# Altium integrated library Weidmueller_OMNIMATE_Power.IntLib: 508 symbols (part 3 of 9) (continued)
## 1095660000_Single (continued)
OMNIMATE Power - series BL/SL 7.62HP; PartNumber: 1095660000; Manufacturer: Weidmueller; Short_text_for_material: BLL 7.62HP/04/90LF SN BK BX; Side_termination_characteristic: Solder flange; Mounting_onto_the_PCB: Solder connection; Pitch_mm: 7.62 mm; Pitch_inch: 0.3 inch; No_of_poles: 4; Solder_pin_length_mm: 3.2 mm; Contact_material: Cu-Leg; Contact_surface: tinned; Insulating_material: PA GF; UL_94_flammability_rating: V-0; Rated_voltage_for_surge_voltage_class_pollution_degree_II_2: 630 V; Rated_voltage_use_group_B_UL_1059: 300 V; Rated_current_use_group_B_UL_1059: 20 A; PackageReference: BLL_7_62HP_90LF_04; Colour: Black; Packaging: Box; Qty: 42 PCS; Revision: V1; ComponentLink1Description: Manufacturer URL; ComponentLink1URL: http://www.weidmueller.com/; ComponentLink2Description: URL Link1; ComponentLink2URL: http://catalog.weidmueller.com/catalog/Start.do?localeId=en&ObjectID=1095660000
footprint BLL_7_62HP_90LF_04 (OMNIMATE Power - Serie BL/SL 7.62HP  BLL 7.62HP/04/90)
part A pins: A1
part B pins: A2
part C pins: A3
part D pins: A4

## 1095920000
designator J?
OMNIMATE Power - series BL/SL 7.62HP; PartNumber: 1095920000; Manufacturer: Weidmueller; Short_text_for_material: SL 7.62HP/02/90LF 3.2 SN BK BX; Side_termination_characteristic: Solder flange; Mounting_onto_the_PCB: Solder connection; Pitch_mm: 7.62 mm; Pitch_inch: 0.3 inch; No_of_poles: 2; Outgoing_elbow: 90°; Solder_pin_length_mm: 3.2 mm; Contact_material: Cu-Leg; Contact_surface: tinned; Insulating_material: PBT; UL_94_flammability_rating: V-0; Rated_voltage_for_surge_voltage_class_pollution_degree_II_2: 630 V; Rated_voltage_use_group_B_UL_1059: 300 V; Rated_current_use_group_B_UL_1059: 20 A; PackageReference: SL_7_62HP_90LF_02; Colour: Black; Packaging: Box; Qty: 100 PCS; Revision: V1; ComponentLink1Description: Manufacturer URL; ComponentLink1URL: http://www.weidmueller.com/; ComponentLink2Description: URL Link1; ComponentLink2URL: http://catalog.weidmueller.com/catalog/Start.do?localeId=en&ObjectID=1095920000
footprint SL_7_62HP_90LF_02 (OMNIMATE Power - Serie BL/SL 7.62HP  SL 7.62HP/02/90F 3.2)
pins: A1, A2

## 1095920000_Single
designator J?
OMNIMATE Power - series BL/SL 7.62HP; PartNumber: 1095920000; Manufacturer: Weidmueller; Short_text_for_material: SL 7.62HP/02/90LF 3.2 SN BK BX; Side_termination_characteristic: Solder flange; Mounting_onto_the_PCB: Solder connection; Pitch_mm: 7.62 mm; Pitch_inch: 0.3 inch; No_of_poles: 2; Outgoing_elbow: 90°; Solder_pin_length_mm: 3.2 mm; Contact_material: Cu-Leg; Contact_surface: tinned; Insulating_material: PBT; UL_94_flammability_rating: V-0; Rated_voltage_for_surge_voltage_class_pollution_degree_II_2: 630 V; Rated_voltage_use_group_B_UL_1059: 300 V; Rated_current_use_group_B_UL_1059: 20 A; PackageReference: SL_7_62HP_90LF_02; Colour: Black; Packaging: Box; Qty: 100 PCS; Revision: V1; ComponentLink1Description: Manufacturer URL; ComponentLink1URL: http://www.weidmueller.com/; ComponentLink2Description: URL Link1; ComponentLink2URL: http://catalog.weidmueller.com/catalog/Start.do?localeId=en&ObjectID=1095920000
footprint SL_7_62HP_90LF_02 (OMNIMATE Power - Serie BL/SL 7.62HP  SL 7.62HP/02/90F 3.2)
part A pins: A1
part B pins: A2

## 1095930000
designator J?
OMNIMATE Power - series BL/SL 7.62HP; PartNumber: 1095930000; Manufacturer: Weidmueller; Short_text_for_material: SL 7.62HP/03/90LF 3.2 SN BK BX; Side_termination_characteristic: Solder flange; Mounting_onto_the_PCB: Solder connection; Pitch_mm: 7.62 mm; Pitch_inch: 0.3 inch; No_of_poles: 3; Outgoing_elbow: 90°; Solder_pin_length_mm: 3.2 mm; Contact_material: Cu-Leg; Contact_surface: tinned; Insulating_material: PBT; UL_94_flammability_rating: V-0; Rated_voltage_for_surge_voltage_class_pollution_degree_II_2: 630 V; Rated_voltage_use_group_B_UL_1059: 300 V; Rated_current_use_group_B_UL_1059: 20 A; PackageReference: SL_7_62HP_90LF_03; Colour: Black; Packaging: Box; Qty: 100 PCS; Revision: V1; ComponentLink1Description: Manufacturer URL; ComponentLink1URL: http://www.weidmueller.com/; ComponentLink2Description: URL Link1; ComponentLink2URL: http://catalog.weidmueller.com/catalog/Start.do?localeId=en&ObjectID=1095930000
footprint SL_7_62HP_90LF_03 (OMNIMATE Power - Serie BL/SL 7.62HP  SL 7.62HP/03/90F 3.2)
pins: A1, A2, A3

## 1095930000_Single
designator J?
OMNIMATE Power - series BL/SL 7.62HP; PartNumber: 1095930000; Manufacturer: Weidmueller; Short_text_for_material: SL 7.62HP/03/90LF 3.2 SN BK BX; Side_termination_characteristic: Solder flange; Mounting_onto_the_PCB: Solder connection; Pitch_mm: 7.62 mm; Pitch_inch: 0.3 inch; No_of_poles: 3; Outgoing_elbow: 90°; Solder_pin_length_mm: 3.2 mm; Contact_material: Cu-Leg; Contact_surface: tinned; Insulating_material: PBT; UL_94_flammability_rating: V-0; Rated_voltage_for_surge_voltage_class_pollution_degree_II_2: 630 V; Rated_voltage_use_group_B_UL_1059: 300 V; Rated_current_use_group_B_UL_1059: 20 A; PackageReference: SL_7_62HP_90LF_03; Colour: Black; Packaging: Box; Qty: 100 PCS; Revision: V1; ComponentLink1Description: Manufacturer URL; ComponentLink1URL: http://www.weidmueller.com/; ComponentLink2Description: URL Link1; ComponentLink2URL: http://catalog.weidmueller.com/catalog/Start.do?localeId=en&ObjectID=1095930000
footprint SL_7_62HP_90LF_03 (OMNIMATE Power - Serie BL/SL 7.62HP  SL 7.62HP/03/90F 3.2)
part A pins: A1
part B pins: A2
part C pins: A3

## 1095940000
designator J?
OMNIMATE Power - series BL/SL 7.62HP; PartNumber: 1095940000; Manufacturer: Weidmueller; Short_text_for_material: SL 7.62HP/04/90LF 3.2 SN BK BX; Side_termination_characteristic: Solder flange; Mounting_onto_the_PCB: Solder connection; Pitch_mm: 7.62 mm; Pitch_inch: 0.3 inch; No_of_poles: 4; Outgoing_elbow: 90°; Solder_pin_length_mm: 3.2 mm; Contact_material: Cu-Leg; Contact_surface: tinned; Insulating_material: PBT; UL_94_flammability_rating: V-0; Rated_voltage_for_surge_voltage_class_pollution_degree_II_2: 630 V; Rated_voltage_use_group_B_UL_1059: 300 V; Rated_current_use_group_B_UL_1059: 20 A; PackageReference: SL_7_62HP_90LF_04; Colour: Black; Packaging: Box; Qty: 100 PCS; Revision: V1; ComponentLink1Description: Manufacturer URL; ComponentLink1URL: http://www.weidmueller.com/; ComponentLink2Description: URL Link1; ComponentLink2URL: http://catalog.weidmueller.com/catalog/Start.do?localeId=en&ObjectID=1095940000
footprint SL_7_62HP_90LF_04 (OMNIMATE Power - Serie BL/SL 7.62HP  SL 7.62HP/04/90F 3.2)
pins: A1, A2, A3, A4

## 1095940000_Single
designator J?
OMNIMATE Power - series BL/SL 7.62HP; PartNumber: 1095940000; Manufacturer: Weidmueller; Short_text_for_material: SL 7.62HP/04/90LF 3.2 SN BK BX; Side_termination_characteristic: Solder flange; Mounting_onto_the_PCB: Solder connection; Pitch_mm: 7.62 mm; Pitch_inch: 0.3 inch; No_of_poles: 4; Outgoing_elbow: 90°; Solder_pin_length_mm: 3.2 mm; Contact_material: Cu-Leg; Contact_surface: tinned; Insulating_material: PBT; UL_94_flammability_rating: V-0; Rated_voltage_for_surge_voltage_class_pollution_degree_II_2: 630 V; Rated_voltage_use_group_B_UL_1059: 300 V; Rated_current_use_group_B_UL_1059: 20 A; PackageReference: SL_7_62HP_90LF_04; Colour: Black; Packaging: Box; Qty: 100 PCS; Revision: V1; ComponentLink1Description: Manufacturer URL; ComponentLink1URL: http://www.weidmueller.com/; ComponentLink2Description: URL Link1; ComponentLink2URL: http://catalog.weidmueller.com/catalog/Start.do?localeId=en&ObjectID=1095940000
footprint SL_7_62HP_90LF_04 (OMNIMATE Power - Serie BL/SL 7.62HP  SL 7.62HP/04/90F 3.2)
part A pins: A1
part B pins: A2
part C pins: A3
part D pins: A4

## 1095980000
designator J?
OMNIMATE Power - series BL/SL 7.62HP; PartNumber: 1095980000; Manufacturer: Weidmueller; Short_text_for_material: SL 7.62HP/08/90LF 3.2 SN BK BX; Side_termination_characteristic: Solder flange; Mounting_onto_the_PCB: Solder connection; Pitch_mm: 7.62 mm; Pitch_inch: 0.3 inch; No_of_poles: 8; Outgoing_elbow: 90°; Solder_pin_length_mm: 3.2 mm; Contact_material: Cu-Leg; Contact_surface: tinned; Insulating_material: PBT; UL_94_flammability_rating: V-0; Rated_voltage_for_surge_voltage_class_pollution_degree_II_2: 630 V; Rated_voltage_use_group_B_UL_1059: 300 V; Rated_current_use_group_B_UL_1059: 20 A; PackageReference: SL_7_62HP_90LF_08; Colour: Black; Packaging: Box; Qty: 50 PCS; Revision: V1; ComponentLink1Description: Manufacturer URL; ComponentLink1URL: http://www.weidmueller.com/; ComponentLink2Description: URL Link1; ComponentLink2URL: http://catalog.weidmueller.com/catalog/Start.do?localeId=en&ObjectID=1095980000
footprint SL_7_62HP_90LF_08 (OMNIMATE Power - Serie BL/SL 7.62HP  SL 7.62HP/08/90F 3.2)
pins: A1, A2, A3, A4, A5, A6, A7, A8

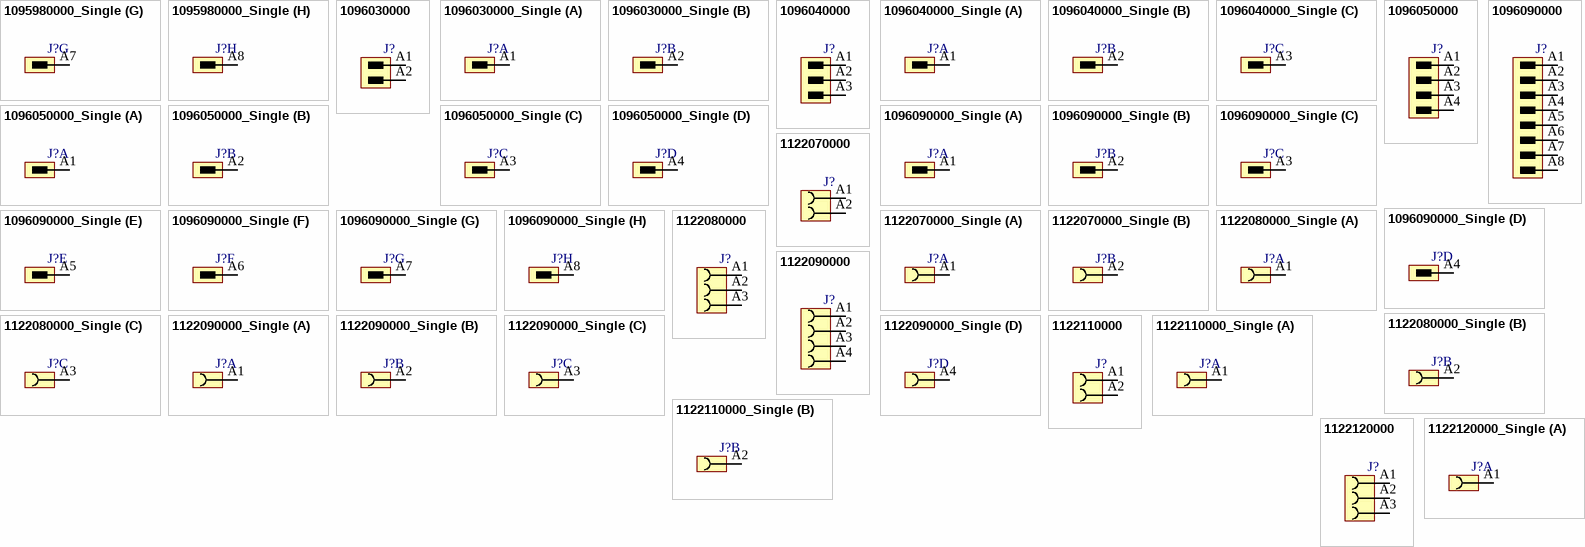
[diagram p9: symbols 1095980000_Single to 1122120000_Single]

## 1095980000_Single
designator J?
OMNIMATE Power - series BL/SL 7.62HP; PartNumber: 1095980000; Manufacturer: Weidmueller; Short_text_for_material: SL 7.62HP/08/90LF 3.2 SN BK BX; Side_termination_characteristic: Solder flange; Mounting_onto_the_PCB: Solder connection; Pitch_mm: 7.62 mm; Pitch_inch: 0.3 inch; No_of_poles: 8; Outgoing_elbow: 90°; Solder_pin_length_mm: 3.2 mm; Contact_material: Cu-Leg; Contact_surface: tinned; Insulating_material: PBT; UL_94_flammability_rating: V-0; Rated_voltage_for_surge_voltage_class_pollution_degree_II_2: 630 V; Rated_voltage_use_group_B_UL_1059: 300 V; Rated_current_use_group_B_UL_1059: 20 A; PackageReference: SL_7_62HP_90LF_08; Colour: Black; Packaging: Box; Qty: 50 PCS; Revision: V1; ComponentLink1Description: Manufacturer URL; ComponentLink1URL: http://www.weidmueller.com/; ComponentLink2Description: URL Link1; ComponentLink2URL: http://catalog.weidmueller.com/catalog/Start.do?localeId=en&ObjectID=1095980000
footprint SL_7_62HP_90LF_08 (OMNIMATE Power - Serie BL/SL 7.62HP  SL 7.62HP/08/90F 3.2)
part A pins: A1
part B pins: A2
part C pins: A3
part D pins: A4
part E pins: A5
part F pins: A6
part G pins: A7
part H pins: A8

## 1096030000
designator J?
OMNIMATE Power - series BL/SL 7.62HP; PartNumber: 1096030000; Manufacturer: Weidmueller; Short_text_for_material: SL 7.62HP/02/90LF 3.2 SN OR BX; Side_termination_characteristic: Solder flange; Mounting_onto_the_PCB: Solder connection; Pitch_mm: 7.62 mm; Pitch_inch: 0.3 inch; No_of_poles: 2; Outgoing_elbow: 90°; Solder_pin_length_mm: 3.2 mm; Contact_surface: tinned; Insulating_material: PBT; UL_94_flammability_rating: V-0; Rated_voltage_for_surge_voltage_class_pollution_degree_II_2: 630 V; Rated_current_min_no_of_poles_TU_20_deg_C: 29 A; Rated_voltage_use_group_B_UL_1059: 300 V; Rated_current_use_group_B_UL_1059: 20 A; PackageReference: SL_7_62HP_90LF_02; Colour: Orange; Packaging: Box; Qty: 100 PCS; Revision: V1; ComponentLink1Description: Manufacturer URL; ComponentLink1URL: http://www.weidmueller.com/; ComponentLink2Description: URL Link1; ComponentLink2URL: http://catalog.weidmueller.com/catalog/Start.do?localeId=en&ObjectID=1096030000
footprint SL_7_62HP_90LF_02 (OMNIMATE Power - Serie BL/SL 7.62HP  SL 7.62HP/02/90F 3.2)
pins: A1, A2

## 1096030000_Single
designator J?
OMNIMATE Power - series BL/SL 7.62HP; PartNumber: 1096030000; Manufacturer: Weidmueller; Short_text_for_material: SL 7.62HP/02/90LF 3.2 SN OR BX; Side_termination_characteristic: Solder flange; Mounting_onto_the_PCB: Solder connection; Pitch_mm: 7.62 mm; Pitch_inch: 0.3 inch; No_of_poles: 2; Outgoing_elbow: 90°; Solder_pin_length_mm: 3.2 mm; Contact_surface: tinned; Insulating_material: PBT; UL_94_flammability_rating: V-0; Rated_voltage_for_surge_voltage_class_pollution_degree_II_2: 630 V; Rated_current_min_no_of_poles_TU_20_deg_C: 29 A; Rated_voltage_use_group_B_UL_1059: 300 V; Rated_current_use_group_B_UL_1059: 20 A; PackageReference: SL_7_62HP_90LF_02; Colour: Orange; Packaging: Box; Qty: 100 PCS; Revision: V1; ComponentLink1Description: Manufacturer URL; ComponentLink1URL: http://www.weidmueller.com/; ComponentLink2Description: URL Link1; ComponentLink2URL: http://catalog.weidmueller.com/catalog/Start.do?localeId=en&ObjectID=1096030000
footprint SL_7_62HP_90LF_02 (OMNIMATE Power - Serie BL/SL 7.62HP  SL 7.62HP/02/90F 3.2)
part A pins: A1
part B pins: A2

## 1096040000
designator J?
OMNIMATE Power - series BL/SL 7.62HP; PartNumber: 1096040000; Manufacturer: Weidmueller; Short_text_for_material: SL 7.62HP/03/90LF 3.2 SN OR BX; Side_termination_characteristic: Solder flange; Mounting_onto_the_PCB: Solder connection; Pitch_mm: 7.62 mm; Pitch_inch: 0.3 inch; No_of_poles: 3; Outgoing_elbow: 90°; Solder_pin_length_mm: 3.2 mm; Contact_surface: tinned; Insulating_material: PBT; UL_94_flammability_rating: V-0; Rated_voltage_for_surge_voltage_class_pollution_degree_II_2: 630 V; Rated_current_min_no_of_poles_TU_20_deg_C: 29 A; Rated_voltage_use_group_B_UL_1059: 300 V; Rated_current_use_group_B_UL_1059: 20 A; PackageReference: SL_7_62HP_90LF_03; Colour: Orange; Packaging: Box; Qty: 100 PCS; Revision: V1; ComponentLink1Description: Manufacturer URL; ComponentLink1URL: http://www.weidmueller.com/; ComponentLink2Description: URL Link1; ComponentLink2URL: http://catalog.weidmueller.com/catalog/Start.do?localeId=en&ObjectID=1096040000
footprint SL_7_62HP_90LF_03 (OMNIMATE Power - Serie BL/SL 7.62HP  SL 7.62HP/03/90F 3.2)
pins: A1, A2, A3

## 1096040000_Single
designator J?
OMNIMATE Power - series BL/SL 7.62HP; PartNumber: 1096040000; Manufacturer: Weidmueller; Short_text_for_material: SL 7.62HP/03/90LF 3.2 SN OR BX; Side_termination_characteristic: Solder flange; Mounting_onto_the_PCB: Solder connection; Pitch_mm: 7.62 mm; Pitch_inch: 0.3 inch; No_of_poles: 3; Outgoing_elbow: 90°; Solder_pin_length_mm: 3.2 mm; Contact_surface: tinned; Insulating_material: PBT; UL_94_flammability_rating: V-0; Rated_voltage_for_surge_voltage_class_pollution_degree_II_2: 630 V; Rated_current_min_no_of_poles_TU_20_deg_C: 29 A; Rated_voltage_use_group_B_UL_1059: 300 V; Rated_current_use_group_B_UL_1059: 20 A; PackageReference: SL_7_62HP_90LF_03; Colour: Orange; Packaging: Box; Qty: 100 PCS; Revision: V1; ComponentLink1Description: Manufacturer URL; ComponentLink1URL: http://www.weidmueller.com/; ComponentLink2Description: URL Link1; ComponentLink2URL: http://catalog.weidmueller.com/catalog/Start.do?localeId=en&ObjectID=1096040000
footprint SL_7_62HP_90LF_03 (OMNIMATE Power - Serie BL/SL 7.62HP  SL 7.62HP/03/90F 3.2)
part A pins: A1
part B pins: A2
part C pins: A3

## 1096050000
designator J?
OMNIMATE Power - series BL/SL 7.62HP; PartNumber: 1096050000; Manufacturer: Weidmueller; Short_text_for_material: SL 7.62HP/04/90LF 3.2 SN OR BX; Side_termination_characteristic: Solder flange; Mounting_onto_the_PCB: Solder connection; Pitch_mm: 7.62 mm; Pitch_inch: 0.3 inch; No_of_poles: 4; Outgoing_elbow: 90°; Solder_pin_length_mm: 3.2 mm; Contact_surface: tinned; Insulating_material: PBT; UL_94_flammability_rating: V-0; Rated_voltage_for_surge_voltage_class_pollution_degree_II_2: 630 V; Rated_current_min_no_of_poles_TU_20_deg_C: 29 A; Rated_voltage_use_group_B_UL_1059: 300 V; Rated_current_use_group_B_UL_1059: 20 A; PackageReference: SL_7_62HP_90LF_04; Colour: Orange; Packaging: Box; Qty: 100 PCS; Revision: V1; ComponentLink1Description: Manufacturer URL; ComponentLink1URL: http://www.weidmueller.com/; ComponentLink2Description: URL Link1; ComponentLink2URL: http://catalog.weidmueller.com/catalog/Start.do?localeId=en&ObjectID=1096050000
footprint SL_7_62HP_90LF_04 (OMNIMATE Power - Serie BL/SL 7.62HP  SL 7.62HP/04/90F 3.2)
pins: A1, A2, A3, A4

## 1096050000_Single
designator J?
OMNIMATE Power - series BL/SL 7.62HP; PartNumber: 1096050000; Manufacturer: Weidmueller; Short_text_for_material: SL 7.62HP/04/90LF 3.2 SN OR BX; Side_termination_characteristic: Solder flange; Mounting_onto_the_PCB: Solder connection; Pitch_mm: 7.62 mm; Pitch_inch: 0.3 inch; No_of_poles: 4; Outgoing_elbow: 90°; Solder_pin_length_mm: 3.2 mm; Contact_surface: tinned; Insulating_material: PBT; UL_94_flammability_rating: V-0; Rated_voltage_for_surge_voltage_class_pollution_degree_II_2: 630 V; Rated_current_min_no_of_poles_TU_20_deg_C: 29 A; Rated_voltage_use_group_B_UL_1059: 300 V; Rated_current_use_group_B_UL_1059: 20 A; PackageReference: SL_7_62HP_90LF_04; Colour: Orange; Packaging: Box; Qty: 100 PCS; Revision: V1; ComponentLink1Description: Manufacturer URL; ComponentLink1URL: http://www.weidmueller.com/; ComponentLink2Description: URL Link1; ComponentLink2URL: http://catalog.weidmueller.com/catalog/Start.do?localeId=en&ObjectID=1096050000
footprint SL_7_62HP_90LF_04 (OMNIMATE Power - Serie BL/SL 7.62HP  SL 7.62HP/04/90F 3.2)
part A pins: A1
part B pins: A2
part C pins: A3
part D pins: A4

## 1096090000
designator J?
OMNIMATE Power - series BL/SL 7.62HP; PartNumber: 1096090000; Manufacturer: Weidmueller; Short_text_for_material: SL 7.62HP/08/90LF 3.2 SN OR BX; Side_termination_characteristic: Solder flange; Mounting_onto_the_PCB: Solder connection; Pitch_mm: 7.62 mm; Pitch_inch: 0.3 inch; No_of_poles: 8; Outgoing_elbow: 90°; Solder_pin_length_mm: 3.2 mm; Contact_surface: tinned; Insulating_material: PBT; UL_94_flammability_rating: V-0; Rated_voltage_for_surge_voltage_class_pollution_degree_II_2: 630 V; Rated_current_min_no_of_poles_TU_20_deg_C: 29 A; Rated_voltage_use_group_B_UL_1059: 300 V; Rated_current_use_group_B_UL_1059: 20 A; PackageReference: SL_7_62HP_90LF_08; Colour: Orange; Packaging: Box; Qty: 50 PCS; Revision: V1; ComponentLink1Description: Manufacturer URL; ComponentLink1URL: http://www.weidmueller.com/; ComponentLink2Description: URL Link1; ComponentLink2URL: http://catalog.weidmueller.com/catalog/Start.do?localeId=en&ObjectID=1096090000
footprint SL_7_62HP_90LF_08 (OMNIMATE Power - Serie BL/SL 7.62HP  SL 7.62HP/08/90F 3.2)
pins: A1, A2, A3, A4, A5, A6, A7, A8

## 1096090000_Single
designator J?
OMNIMATE Power - series BL/SL 7.62HP; PartNumber: 1096090000; Manufacturer: Weidmueller; Short_text_for_material: SL 7.62HP/08/90LF 3.2 SN OR BX; Side_termination_characteristic: Solder flange; Mounting_onto_the_PCB: Solder connection; Pitch_mm: 7.62 mm; Pitch_inch: 0.3 inch; No_of_poles: 8; Outgoing_elbow: 90°; Solder_pin_length_mm: 3.2 mm; Contact_surface: tinned; Insulating_material: PBT; UL_94_flammability_rating: V-0; Rated_voltage_for_surge_voltage_class_pollution_degree_II_2: 630 V; Rated_current_min_no_of_poles_TU_20_deg_C: 29 A; Rated_voltage_use_group_B_UL_1059: 300 V; Rated_current_use_group_B_UL_1059: 20 A; PackageReference: SL_7_62HP_90LF_08; Colour: Orange; Packaging: Box; Qty: 50 PCS; Revision: V1; ComponentLink1Description: Manufacturer URL; ComponentLink1URL: http://www.weidmueller.com/; ComponentLink2Description: URL Link1; ComponentLink2URL: http://catalog.weidmueller.com/catalog/Start.do?localeId=en&ObjectID=1096090000
footprint SL_7_62HP_90LF_08 (OMNIMATE Power - Serie BL/SL 7.62HP  SL 7.62HP/08/90F 3.2)
part A pins: A1
part B pins: A2
part C pins: A3
part D pins: A4
part E pins: A5
part F pins: A6
part G pins: A7
part H pins: A8

## 1122070000
designator J?
OMNIMATE Power - series BL/SL 7.62HP; PartNumber: 1122070000; Manufacturer: Weidmueller; Short_text_for_material: BLL 7.62HP/02/180 3.2SN BK BX; Side_termination_characteristic: closed side; Mounting_onto_the_PCB: Solder connection; Pitch_mm: 7.62 mm; Pitch_inch: 0.3 inch; No_of_poles: 2; Outgoing_elbow: 180°; Solder_pin_length_mm: 3.2 mm; Contact_material: Cu-Leg; Contact_surface: tinned; Insulating_material: PA GF; UL_94_flammability_rating: V-0; Rated_voltage_for_surge_voltage_class_pollution_degree_II_2: 630 V; Rated_voltage_use_group_B_UL_1059: 300 V; Rated_current_use_group_B_UL_1059: 20 A; PackageReference: BLL_7_62HP_180G_02; Colour: Black; Packaging: Box; Qty: 126 PCS; Revision: V1; ComponentLink1Description: Manufacturer URL; ComponentLink1URL: http://www.weidmueller.com/; ComponentLink2Description: URL Link1; ComponentLink2URL: http://catalog.weidmueller.com/catalog/Start.do?localeId=en&ObjectID=1122070000
footprint BLL_7_62HP_180G_02 (OMNIMATE Power - Serie BL/SL 7.62HP  BLL 7.62HP/02/180 3.2)
pins: A1, A2

## 1122070000_Single
designator J?
OMNIMATE Power - series BL/SL 7.62HP; PartNumber: 1122070000; Manufacturer: Weidmueller; Short_text_for_material: BLL 7.62HP/02/180 3.2SN BK BX; Side_termination_characteristic: closed side; Mounting_onto_the_PCB: Solder connection; Pitch_mm: 7.62 mm; Pitch_inch: 0.3 inch; No_of_poles: 2; Outgoing_elbow: 180°; Solder_pin_length_mm: 3.2 mm; Contact_material: Cu-Leg; Contact_surface: tinned; Insulating_material: PA GF; UL_94_flammability_rating: V-0; Rated_voltage_for_surge_voltage_class_pollution_degree_II_2: 630 V; Rated_voltage_use_group_B_UL_1059: 300 V; Rated_current_use_group_B_UL_1059: 20 A; PackageReference: BLL_7_62HP_180G_02; Colour: Black; Packaging: Box; Qty: 126 PCS; Revision: V1; ComponentLink1Description: Manufacturer URL; ComponentLink1URL: http://www.weidmueller.com/; ComponentLink2Description: URL Link1; ComponentLink2URL: http://catalog.weidmueller.com/catalog/Start.do?localeId=en&ObjectID=1122070000
footprint BLL_7_62HP_180G_02 (OMNIMATE Power - Serie BL/SL 7.62HP  BLL 7.62HP/02/180 3.2)
part A pins: A1
part B pins: A2

## 1122080000
designator J?
OMNIMATE Power - series BL/SL 7.62HP; PartNumber: 1122080000; Manufacturer: Weidmueller; Short_text_for_material: BLL 7.62HP/03/180 3.2SN BK BX; Side_termination_characteristic: closed side; Mounting_onto_the_PCB: Solder connection; Pitch_mm: 7.62 mm; Pitch_inch: 0.3 inch; No_of_poles: 3; Outgoing_elbow: 180°; Solder_pin_length_mm: 3.2 mm; Contact_material: Cu-Leg; Contact_surface: tinned; Insulating_material: PA GF; UL_94_flammability_rating: V-0; Rated_voltage_for_surge_voltage_class_pollution_degree_II_2: 630 V; Rated_voltage_use_group_B_UL_1059: 300 V; Rated_current_use_group_B_UL_1059: 20 A; PackageReference: BLL_7_62HP_180G_03; Colour: Black; Packaging: Box; Qty: 84 PCS; Revision: V1; ComponentLink1Description: Manufacturer URL; ComponentLink1URL: http://www.weidmueller.com/; ComponentLink2Description: URL Link1; ComponentLink2URL: http://catalog.weidmueller.com/catalog/Start.do?localeId=en&ObjectID=1122080000
footprint BLL_7_62HP_180G_03 (OMNIMATE Power - Serie BL/SL 7.62HP  BLL 7.62HP/03/180 3.2)
pins: A1, A2, A3

## 1122080000_Single
designator J?
OMNIMATE Power - series BL/SL 7.62HP; PartNumber: 1122080000; Manufacturer: Weidmueller; Short_text_for_material: BLL 7.62HP/03/180 3.2SN BK BX; Side_termination_characteristic: closed side; Mounting_onto_the_PCB: Solder connection; Pitch_mm: 7.62 mm; Pitch_inch: 0.3 inch; No_of_poles: 3; Outgoing_elbow: 180°; Solder_pin_length_mm: 3.2 mm; Contact_material: Cu-Leg; Contact_surface: tinned; Insulating_material: PA GF; UL_94_flammability_rating: V-0; Rated_voltage_for_surge_voltage_class_pollution_degree_II_2: 630 V; Rated_voltage_use_group_B_UL_1059: 300 V; Rated_current_use_group_B_UL_1059: 20 A; PackageReference: BLL_7_62HP_180G_03; Colour: Black; Packaging: Box; Qty: 84 PCS; Revision: V1; ComponentLink1Description: Manufacturer URL; ComponentLink1URL: http://www.weidmueller.com/; ComponentLink2Description: URL Link1; ComponentLink2URL: http://catalog.weidmueller.com/catalog/Start.do?localeId=en&ObjectID=1122080000
footprint BLL_7_62HP_180G_03 (OMNIMATE Power - Serie BL/SL 7.62HP  BLL 7.62HP/03/180 3.2)
part A pins: A1
part B pins: A2
part C pins: A3

## 1122090000
designator J?
OMNIMATE Power - series BL/SL 7.62HP; PartNumber: 1122090000; Manufacturer: Weidmueller; Short_text_for_material: BLL 7.62HP/04/180 3.2SN BK BX; Side_termination_characteristic: closed side; Mounting_onto_the_PCB: Solder connection; Pitch_mm: 7.62 mm; Pitch_inch: 0.3 inch; No_of_poles: 4; Outgoing_elbow: 180°; Solder_pin_length_mm: 3.2 mm; Contact_material: Cu-Leg; Contact_surface: tinned; Insulating_material: PA GF; UL_94_flammability_rating: V-0; Rated_voltage_for_surge_voltage_class_pollution_degree_II_2: 630 V; Rated_voltage_use_group_B_UL_1059: 300 V; Rated_current_use_group_B_UL_1059: 20 A; PackageReference: BLL_7_62HP_180G_04; Colour: Black; Packaging: Box; Qty: 60 PCS; Revision: V1; ComponentLink1Description: Manufacturer URL; ComponentLink1URL: http://www.weidmueller.com/; ComponentLink2Description: URL Link1; ComponentLink2URL: http://catalog.weidmueller.com/catalog/Start.do?localeId=en&ObjectID=1122090000
footprint BLL_7_62HP_180G_04 (OMNIMATE Power - Serie BL/SL 7.62HP  BLL 7.62HP/04/180 3.2)
pins: A1, A2, A3, A4

## 1122090000_Single
designator J?
OMNIMATE Power - series BL/SL 7.62HP; PartNumber: 1122090000; Manufacturer: Weidmueller; Short_text_for_material: BLL 7.62HP/04/180 3.2SN BK BX; Side_termination_characteristic: closed side; Mounting_onto_the_PCB: Solder connection; Pitch_mm: 7.62 mm; Pitch_inch: 0.3 inch; No_of_poles: 4; Outgoing_elbow: 180°; Solder_pin_length_mm: 3.2 mm; Contact_material: Cu-Leg; Contact_surface: tinned; Insulating_material: PA GF; UL_94_flammability_rating: V-0; Rated_voltage_for_surge_voltage_class_pollution_degree_II_2: 630 V; Rated_voltage_use_group_B_UL_1059: 300 V; Rated_current_use_group_B_UL_1059: 20 A; PackageReference: BLL_7_62HP_180G_04; Colour: Black; Packaging: Box; Qty: 60 PCS; Revision: V1; ComponentLink1Description: Manufacturer URL; ComponentLink1URL: http://www.weidmueller.com/; ComponentLink2Description: URL Link1; ComponentLink2URL: http://catalog.weidmueller.com/catalog/Start.do?localeId=en&ObjectID=1122090000
footprint BLL_7_62HP_180G_04 (OMNIMATE Power - Serie BL/SL 7.62HP  BLL 7.62HP/04/180 3.2)
part A pins: A1
part B pins: A2
part C pins: A3
part D pins: A4

## 1122110000
designator J?
OMNIMATE Power - series BL/SL 7.62HP; PartNumber: 1122110000; Manufacturer: Weidmueller; Short_text_for_material: BLL 7.62HP/02/180F 3.2SN BK BX; Side_termination_characteristic: Flange; Mounting_onto_the_PCB: Solder connection; Pitch_mm: 7.62 mm; Pitch_inch: 0.3 inch; No_of_poles: 2; Outgoing_elbow: 180°; Solder_pin_length_mm: 3.2 mm; Contact_material: Cu-Leg; Contact_surface: tinned; Insulating_material: PA GF; UL_94_flammability_rating: V-0; Rated_voltage_for_surge_voltage_class_pollution_degree_II_2: 630 V; Rated_voltage_use_group_B_UL_1059: 300 V; Rated_current_use_group_B_UL_1059: 20 A; PackageReference: BLL_7_62HP_180F_02; Colour: Black; Packaging: Box; Qty: 72 PCS; Revision: V1; ComponentLink1Description: Manufacturer URL; ComponentLink1URL: http://www.weidmueller.com/; ComponentLink2Description: URL Link1; ComponentLink2URL: http://catalog.weidmueller.com/catalog/Start.do?localeId=en&ObjectID=1122110000
footprint BLL_7_62HP_180F_02 (OMNIMATE Power - Serie BL/SL 7.62HP  BLL 7.62HP/02/180F 3.2)
pins: A1, A2

## 1122110000_Single
designator J?
OMNIMATE Power - series BL/SL 7.62HP; PartNumber: 1122110000; Manufacturer: Weidmueller; Short_text_for_material: BLL 7.62HP/02/180F 3.2SN BK BX; Side_termination_characteristic: Flange; Mounting_onto_the_PCB: Solder connection; Pitch_mm: 7.62 mm; Pitch_inch: 0.3 inch; No_of_poles: 2; Outgoing_elbow: 180°; Solder_pin_length_mm: 3.2 mm; Contact_material: Cu-Leg; Contact_surface: tinned; Insulating_material: PA GF; UL_94_flammability_rating: V-0; Rated_voltage_for_surge_voltage_class_pollution_degree_II_2: 630 V; Rated_voltage_use_group_B_UL_1059: 300 V; Rated_current_use_group_B_UL_1059: 20 A; PackageReference: BLL_7_62HP_180F_02; Colour: Black; Packaging: Box; Qty: 72 PCS; Revision: V1; ComponentLink1Description: Manufacturer URL; ComponentLink1URL: http://www.weidmueller.com/; ComponentLink2Description: URL Link1; ComponentLink2URL: http://catalog.weidmueller.com/catalog/Start.do?localeId=en&ObjectID=1122110000
footprint BLL_7_62HP_180F_02 (OMNIMATE Power - Serie BL/SL 7.62HP  BLL 7.62HP/02/180F 3.2)
part A pins: A1
part B pins: A2

## 1122120000
designator J?
OMNIMATE Power - series BL/SL 7.62HP; PartNumber: 1122120000; Manufacturer: Weidmueller; Short_text_for_material: BLL 7.62HP/03/180F 3.2SN BK BX; Side_termination_characteristic: Flange; Mounting_onto_the_PCB: Solder connection; Pitch_mm: 7.62 mm; Pitch_inch: 0.3 inch; No_of_poles: 3; Outgoing_elbow: 180°; Solder_pin_length_mm: 3.2 mm; Contact_material: Cu-Leg; Contact_surface: tinned; Insulating_material: PA GF; UL_94_flammability_rating: V-0; Rated_voltage_for_surge_voltage_class_pollution_degree_II_2: 630 V; Rated_voltage_use_group_B_UL_1059: 300 V; Rated_current_use_group_B_UL_1059: 20 A; PackageReference: BLL_7_62HP_180F_03; Colour: Black; Packaging: Box; Qty: 54 PCS; Revision: V1; ComponentLink1Description: Manufacturer URL; ComponentLink1URL: http://www.weidmueller.com/; ComponentLink2Description: URL Link1; ComponentLink2URL: http://catalog.weidmueller.com/catalog/Start.do?localeId=en&ObjectID=1122120000
footprint BLL_7_62HP_180F_03 (OMNIMATE Power - Serie BL/SL 7.62HP  BLL 7.62HP/03/180F 3.2)
pins: A1, A2, A3

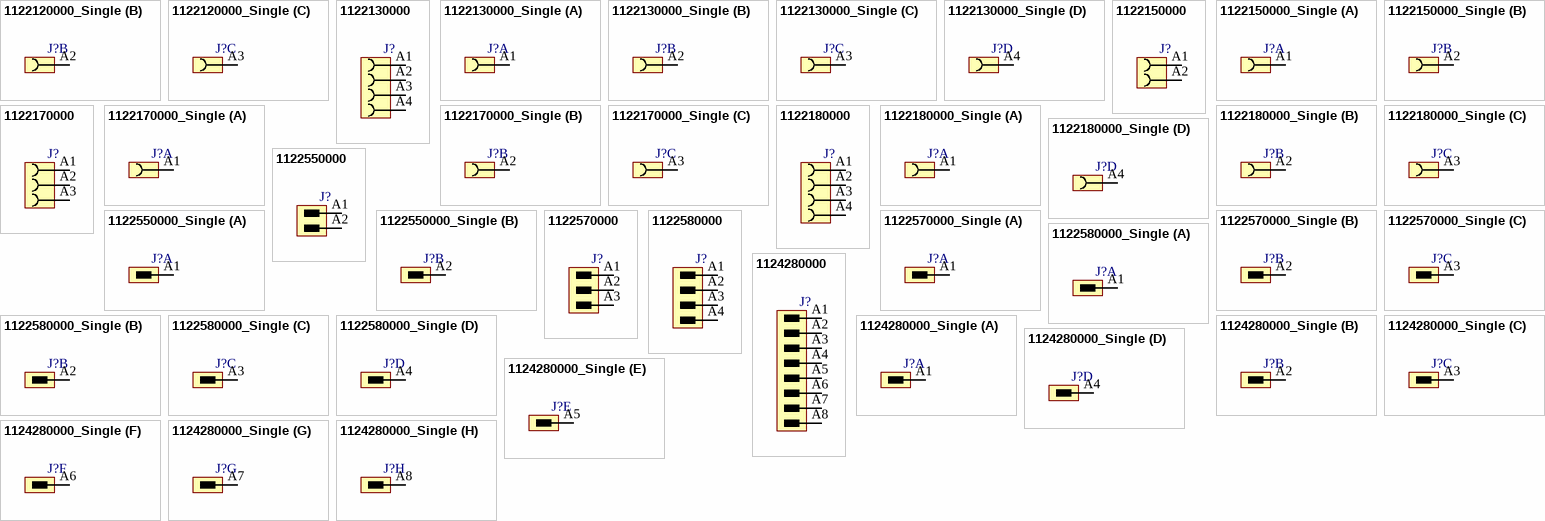
[diagram p10: symbols 1122120000_Single to 1124280000_Single]

## 1122120000_Single
designator J?
OMNIMATE Power - series BL/SL 7.62HP; PartNumber: 1122120000; Manufacturer: Weidmueller; Short_text_for_material: BLL 7.62HP/03/180F 3.2SN BK BX; Side_termination_characteristic: Flange; Mounting_onto_the_PCB: Solder connection; Pitch_mm: 7.62 mm; Pitch_inch: 0.3 inch; No_of_poles: 3; Outgoing_elbow: 180°; Solder_pin_length_mm: 3.2 mm; Contact_material: Cu-Leg; Contact_surface: tinned; Insulating_material: PA GF; UL_94_flammability_rating: V-0; Rated_voltage_for_surge_voltage_class_pollution_degree_II_2: 630 V; Rated_voltage_use_group_B_UL_1059: 300 V; Rated_current_use_group_B_UL_1059: 20 A; PackageReference: BLL_7_62HP_180F_03; Colour: Black; Packaging: Box; Qty: 54 PCS; Revision: V1; ComponentLink1Description: Manufacturer URL; ComponentLink1URL: http://www.weidmueller.com/; ComponentLink2Description: URL Link1; ComponentLink2URL: http://catalog.weidmueller.com/catalog/Start.do?localeId=en&ObjectID=1122120000
footprint BLL_7_62HP_180F_03 (OMNIMATE Power - Serie BL/SL 7.62HP  BLL 7.62HP/03/180F 3.2)
part A pins: A1
part B pins: A2
part C pins: A3

## 1122130000
designator J?
OMNIMATE Power - series BL/SL 7.62HP; PartNumber: 1122130000; Manufacturer: Weidmueller; Short_text_for_material: BLL 7.62HP/04/180F 3.2SN BK BX; Side_termination_characteristic: Flange; Mounting_onto_the_PCB: Solder connection; Pitch_mm: 7.62 mm; Pitch_inch: 0.3 inch; No_of_poles: 4; Outgoing_elbow: 180°; Solder_pin_length_mm: 3.2 mm; Contact_material: Cu-Leg; Contact_surface: tinned; Insulating_material: PA GF; UL_94_flammability_rating: V-0; Rated_voltage_for_surge_voltage_class_pollution_degree_II_2: 630 V; Rated_voltage_use_group_B_UL_1059: 300 V; Rated_current_use_group_B_UL_1059: 20 A; PackageReference: BLL_7_62HP_180F_04; Colour: Black; Packaging: Box; Qty: 42 PCS; Revision: V1; ComponentLink1Description: Manufacturer URL; ComponentLink1URL: http://www.weidmueller.com/; ComponentLink2Description: URL Link1; ComponentLink2URL: http://catalog.weidmueller.com/catalog/Start.do?localeId=en&ObjectID=1122130000
footprint BLL_7_62HP_180F_04 (OMNIMATE Power - Serie BL/SL 7.62HP  BLL 7.62HP/04/180F 3.2)
pins: A1, A2, A3, A4

## 1122130000_Single
designator J?
OMNIMATE Power - series BL/SL 7.62HP; PartNumber: 1122130000; Manufacturer: Weidmueller; Short_text_for_material: BLL 7.62HP/04/180F 3.2SN BK BX; Side_termination_characteristic: Flange; Mounting_onto_the_PCB: Solder connection; Pitch_mm: 7.62 mm; Pitch_inch: 0.3 inch; No_of_poles: 4; Outgoing_elbow: 180°; Solder_pin_length_mm: 3.2 mm; Contact_material: Cu-Leg; Contact_surface: tinned; Insulating_material: PA GF; UL_94_flammability_rating: V-0; Rated_voltage_for_surge_voltage_class_pollution_degree_II_2: 630 V; Rated_voltage_use_group_B_UL_1059: 300 V; Rated_current_use_group_B_UL_1059: 20 A; PackageReference: BLL_7_62HP_180F_04; Colour: Black; Packaging: Box; Qty: 42 PCS; Revision: V1; ComponentLink1Description: Manufacturer URL; ComponentLink1URL: http://www.weidmueller.com/; ComponentLink2Description: URL Link1; ComponentLink2URL: http://catalog.weidmueller.com/catalog/Start.do?localeId=en&ObjectID=1122130000
footprint BLL_7_62HP_180F_04 (OMNIMATE Power - Serie BL/SL 7.62HP  BLL 7.62HP/04/180F 3.2)
part A pins: A1
part B pins: A2
part C pins: A3
part D pins: A4

## 1122150000
designator J?
OMNIMATE Power - series BL/SL 7.62HP; PartNumber: 1122150000; Manufacturer: Weidmueller; Short_text_for_material: BLL 7.62HP/02/180F 3.2SN OR BX; Side_termination_characteristic: Flange; Mounting_onto_the_PCB: Solder connection; Pitch_mm: 7.62 mm; Pitch_inch: 0.3 inch; No_of_poles: 2; Outgoing_elbow: 180°; Solder_pin_length_mm: 3.2 mm; Contact_surface: tinned; Insulating_material: PA GF; UL_94_flammability_rating: V-0; Rated_voltage_for_surge_voltage_class_pollution_degree_II_2: 630 V; Rated_current_min_no_of_poles_TU_20_deg_C: 24 A; Rated_voltage_use_group_B_UL_1059: 300 V; Rated_current_use_group_B_UL_1059: 20 A; PackageReference: BLL_7_62HP_180F_02; Colour: Orange; Packaging: Box; Qty: 72 PCS; Revision: V1; ComponentLink1Description: Manufacturer URL; ComponentLink1URL: http://www.weidmueller.com/; ComponentLink2Description: URL Link1; ComponentLink2URL: http://catalog.weidmueller.com/catalog/Start.do?localeId=en&ObjectID=1122150000
footprint BLL_7_62HP_180F_02 (OMNIMATE Power - Serie BL/SL 7.62HP  BLL 7.62HP/02/180F 3.2)
pins: A1, A2

## 1122150000_Single
designator J?
OMNIMATE Power - series BL/SL 7.62HP; PartNumber: 1122150000; Manufacturer: Weidmueller; Short_text_for_material: BLL 7.62HP/02/180F 3.2SN OR BX; Side_termination_characteristic: Flange; Mounting_onto_the_PCB: Solder connection; Pitch_mm: 7.62 mm; Pitch_inch: 0.3 inch; No_of_poles: 2; Outgoing_elbow: 180°; Solder_pin_length_mm: 3.2 mm; Contact_surface: tinned; Insulating_material: PA GF; UL_94_flammability_rating: V-0; Rated_voltage_for_surge_voltage_class_pollution_degree_II_2: 630 V; Rated_current_min_no_of_poles_TU_20_deg_C: 24 A; Rated_voltage_use_group_B_UL_1059: 300 V; Rated_current_use_group_B_UL_1059: 20 A; PackageReference: BLL_7_62HP_180F_02; Colour: Orange; Packaging: Box; Qty: 72 PCS; Revision: V1; ComponentLink1Description: Manufacturer URL; ComponentLink1URL: http://www.weidmueller.com/; ComponentLink2Description: URL Link1; ComponentLink2URL: http://catalog.weidmueller.com/catalog/Start.do?localeId=en&ObjectID=1122150000
footprint BLL_7_62HP_180F_02 (OMNIMATE Power - Serie BL/SL 7.62HP  BLL 7.62HP/02/180F 3.2)
part A pins: A1
part B pins: A2

## 1122170000
designator J?
OMNIMATE Power - series BL/SL 7.62HP; PartNumber: 1122170000; Manufacturer: Weidmueller; Short_text_for_material: BLL 7.62HP/03/180F 3.2SN OR BX; Side_termination_characteristic: Flange; Mounting_onto_the_PCB: Solder connection; Pitch_mm: 7.62 mm; Pitch_inch: 0.3 inch; No_of_poles: 3; Outgoing_elbow: 180°; Solder_pin_length_mm: 3.2 mm; Contact_surface: tinned; Insulating_material: PA GF; UL_94_flammability_rating: V-0; Rated_voltage_for_surge_voltage_class_pollution_degree_II_2: 630 V; Rated_current_min_no_of_poles_TU_20_deg_C: 24 A; Rated_voltage_use_group_B_UL_1059: 300 V; Rated_current_use_group_B_UL_1059: 20 A; PackageReference: BLL_7_62HP_180F_03; Colour: Orange; Packaging: Box; Qty: 54 PCS; Revision: V1; ComponentLink1Description: Manufacturer URL; ComponentLink1URL: http://www.weidmueller.com/; ComponentLink2Description: URL Link1; ComponentLink2URL: http://catalog.weidmueller.com/catalog/Start.do?localeId=en&ObjectID=1122170000
footprint BLL_7_62HP_180F_03 (OMNIMATE Power - Serie BL/SL 7.62HP  BLL 7.62HP/03/180F 3.2)
pins: A1, A2, A3

## 1122170000_Single
designator J?
OMNIMATE Power - series BL/SL 7.62HP; PartNumber: 1122170000; Manufacturer: Weidmueller; Short_text_for_material: BLL 7.62HP/03/180F 3.2SN OR BX; Side_termination_characteristic: Flange; Mounting_onto_the_PCB: Solder connection; Pitch_mm: 7.62 mm; Pitch_inch: 0.3 inch; No_of_poles: 3; Outgoing_elbow: 180°; Solder_pin_length_mm: 3.2 mm; Contact_surface: tinned; Insulating_material: PA GF; UL_94_flammability_rating: V-0; Rated_voltage_for_surge_voltage_class_pollution_degree_II_2: 630 V; Rated_current_min_no_of_poles_TU_20_deg_C: 24 A; Rated_voltage_use_group_B_UL_1059: 300 V; Rated_current_use_group_B_UL_1059: 20 A; PackageReference: BLL_7_62HP_180F_03; Colour: Orange; Packaging: Box; Qty: 54 PCS; Revision: V1; ComponentLink1Description: Manufacturer URL; ComponentLink1URL: http://www.weidmueller.com/; ComponentLink2Description: URL Link1; ComponentLink2URL: http://catalog.weidmueller.com/catalog/Start.do?localeId=en&ObjectID=1122170000
footprint BLL_7_62HP_180F_03 (OMNIMATE Power - Serie BL/SL 7.62HP  BLL 7.62HP/03/180F 3.2)
part A pins: A1
part B pins: A2
part C pins: A3

## 1122180000
designator J?
OMNIMATE Power - series BL/SL 7.62HP; PartNumber: 1122180000; Manufacturer: Weidmueller; Short_text_for_material: BLL 7.62HP/04/180F 3.2SN OR BX; Side_termination_characteristic: Flange; Mounting_onto_the_PCB: Solder connection; Pitch_mm: 7.62 mm; Pitch_inch: 0.3 inch; No_of_poles: 4; Outgoing_elbow: 180°; Solder_pin_length_mm: 3.2 mm; Contact_surface: tinned; Insulating_material: PA GF; UL_94_flammability_rating: V-0; Rated_voltage_for_surge_voltage_class_pollution_degree_II_2: 630 V; Rated_current_min_no_of_poles_TU_20_deg_C: 24 A; Rated_voltage_use_group_B_UL_1059: 300 V; Rated_current_use_group_B_UL_1059: 20 A; PackageReference: BLL_7_62HP_180F_04; Colour: Orange; Packaging: Box; Qty: 42 PCS; Revision: V1; ComponentLink1Description: Manufacturer URL; ComponentLink1URL: http://www.weidmueller.com/; ComponentLink2Description: URL Link1; ComponentLink2URL: http://catalog.weidmueller.com/catalog/Start.do?localeId=en&ObjectID=1122180000
footprint BLL_7_62HP_180F_04 (OMNIMATE Power - Serie BL/SL 7.62HP  BLL 7.62HP/04/180F 3.2)
pins: A1, A2, A3, A4

## 1122180000_Single
designator J?
OMNIMATE Power - series BL/SL 7.62HP; PartNumber: 1122180000; Manufacturer: Weidmueller; Short_text_for_material: BLL 7.62HP/04/180F 3.2SN OR BX; Side_termination_characteristic: Flange; Mounting_onto_the_PCB: Solder connection; Pitch_mm: 7.62 mm; Pitch_inch: 0.3 inch; No_of_poles: 4; Outgoing_elbow: 180°; Solder_pin_length_mm: 3.2 mm; Contact_surface: tinned; Insulating_material: PA GF; UL_94_flammability_rating: V-0; Rated_voltage_for_surge_voltage_class_pollution_degree_II_2: 630 V; Rated_current_min_no_of_poles_TU_20_deg_C: 24 A; Rated_voltage_use_group_B_UL_1059: 300 V; Rated_current_use_group_B_UL_1059: 20 A; PackageReference: BLL_7_62HP_180F_04; Colour: Orange; Packaging: Box; Qty: 42 PCS; Revision: V1; ComponentLink1Description: Manufacturer URL; ComponentLink1URL: http://www.weidmueller.com/; ComponentLink2Description: URL Link1; ComponentLink2URL: http://catalog.weidmueller.com/catalog/Start.do?localeId=en&ObjectID=1122180000
footprint BLL_7_62HP_180F_04 (OMNIMATE Power - Serie BL/SL 7.62HP  BLL 7.62HP/04/180F 3.2)
part A pins: A1
part B pins: A2
part C pins: A3
part D pins: A4